# Altium footprint library PCB-Connectors-2.54mm-排针排母.PCBLIB: 183 footprints (part 3 of 12)
Each footprint in its own frame and in the unit in brackets; x right, y up, seen from the top. Pads: shape width x height; smd on the part's side, far side on the other; paste and mask are expansions set on the pad; w line width, h text height; cw(c..) or ccw(c..) is an arc to the next point about the centre after c.
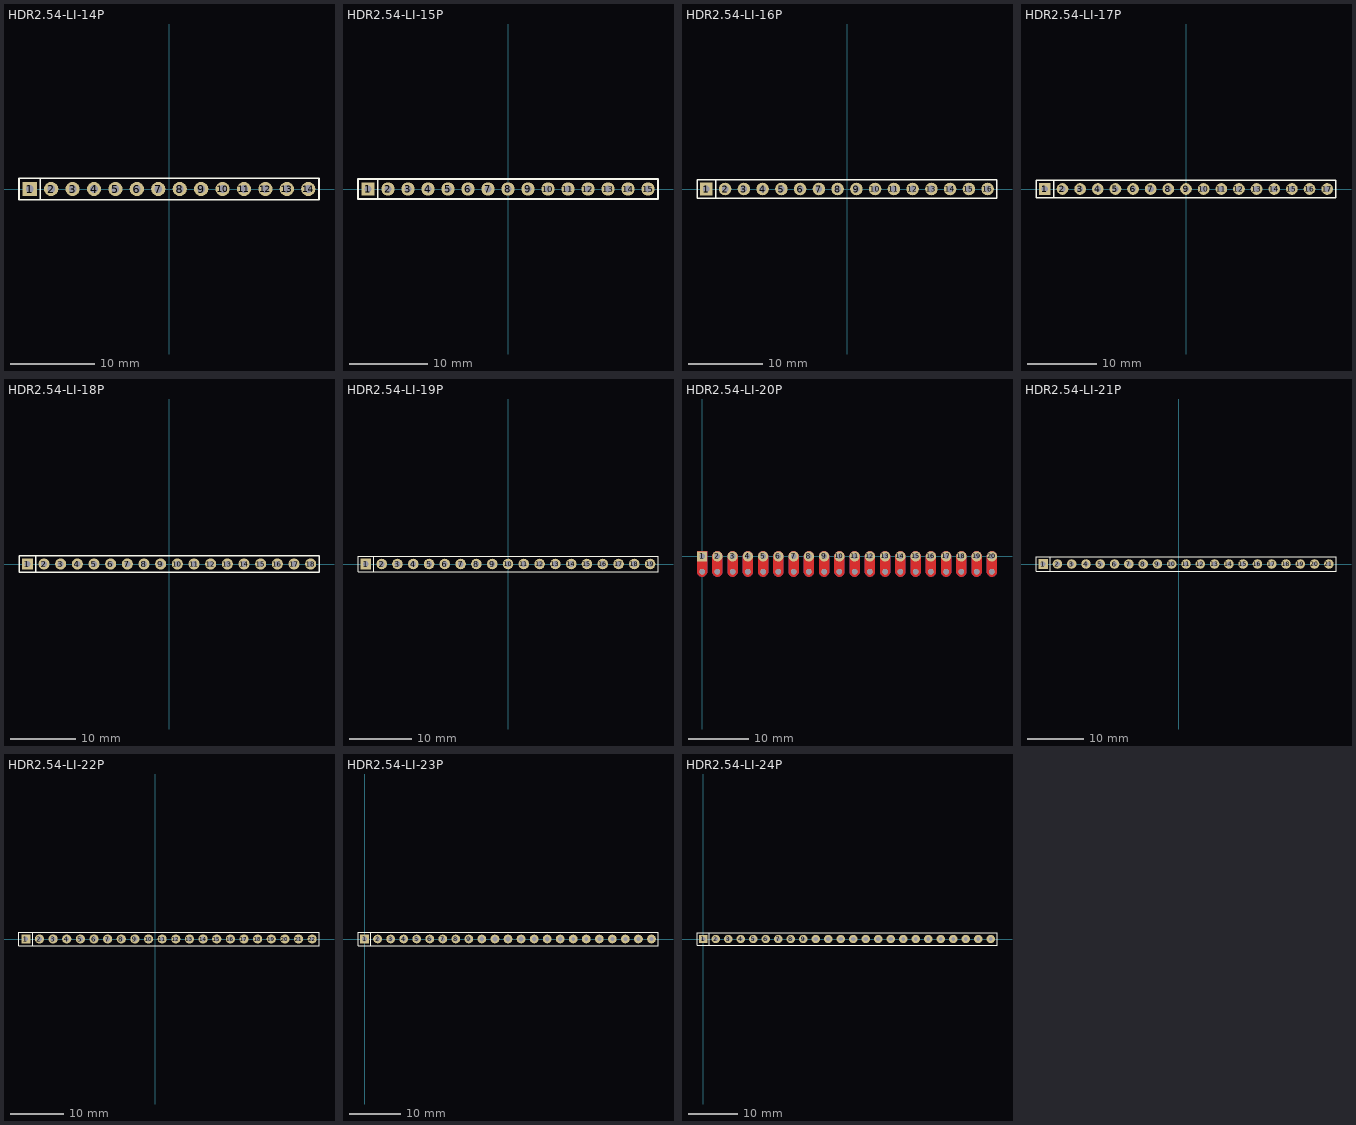
[diagram p2: the footprints below, top view; thin cyan lines are the x and y axes]

## HDR2.54-LI-14P [mm]
pads (14):
  rect 1.7x1.7 hole 0.9: 1(-16.51,0)
  round 1.7 hole 0.9: 2(-13.97,0) 3(-11.43,0) 4(-8.89,0) 5(-6.35,0) 6(-3.81,0) 7(-1.27,0) 8(1.27,0) 9(3.81,0) 10(6.35,0) 11(8.89,0) 12(11.43,0) 13(13.97,0) 14(16.51,0)
Top Overlay:
  lines w0.2: -15.26,-1.25 -15.26,1.25 ; -17.78,-1.27 17.78,-1.27 17.78,1.27 -15.875,1.27 -17.78,1.27 -17.78,-1.27
3D body "HDR2.54-1P.STEP": height 2.54, standoff -8.96, extent -17.78,-1.27 -15.24,1.27
3D body "HDR2.54-1P.STEP": height 2.54, standoff -8.96, extent -15.24,-1.27 -12.7,1.27
3D body "HDR2.54-1P.STEP": height 2.54, standoff -8.96, extent -12.7,-1.27 -10.16,1.27
3D body "HDR2.54-1P.STEP": height 2.54, standoff -8.96, extent -10.16,-1.27 -7.62,1.27
3D body "HDR2.54-1P.STEP": height 2.54, standoff -8.96, extent -7.62,-1.27 -5.08,1.27
3D body "HDR2.54-1P.STEP": height 2.54, standoff -8.96, extent -5.08,-1.27 -2.54,1.27
3D body "HDR2.54-1P.STEP": height 2.54, standoff -8.96, extent -2.54,-1.27 0,1.27
3D body "HDR2.54-1P.STEP": height 2.54, standoff -8.96, extent 0,-1.27 2.54,1.27
3D body "HDR2.54-1P.STEP": height 2.54, standoff -8.96, extent 2.54,-1.27 5.08,1.27
3D body "HDR2.54-1P.STEP": height 2.54, standoff -8.96, extent 5.08,-1.27 7.62,1.27
3D body "HDR2.54-1P.STEP": height 2.54, standoff -8.96, extent 7.62,-1.27 10.16,1.27
3D body "HDR2.54-1P.STEP": height 2.54, standoff -8.96, extent 10.16,-1.27 12.7,1.27
3D body "HDR2.54-1P.STEP": height 2.54, standoff -8.96, extent 12.7,-1.27 15.24,1.27
3D body "HDR2.54-1P.STEP": height 2.54, standoff -8.96, extent 15.24,-1.27 17.78,1.27

## HDR2.54-LI-15P [mm]
pads (15):
  rect 1.7x1.7 hole 0.9: 1(-17.78,0)
  round 1.7 hole 0.9: 2(-15.24,0) 3(-12.7,0) 4(-10.16,0) 5(-7.62,0) 6(-5.08,0) 7(-2.54,0) 8(0,0) 9(2.54,0) 10(5.08,0) 11(7.62,0) 12(10.16,0) 13(12.7,0) 14(15.24,0) 15(17.78,0)
Top Overlay:
  lines w0.2: -16.53,-1.25 -16.53,1.25 ; -19.05,-1.27 19.05,-1.27 19.05,1.27 -17.145,1.27 -19.05,1.27 -19.05,-1.27
3D body "HDR2.54-1P.STEP": height 2.54, standoff -8.96, extent 16.51,-1.27 19.05,1.27
3D body "HDR2.54-1P.STEP": height 2.54, standoff -8.96, extent 13.97,-1.27 16.51,1.27
3D body "HDR2.54-1P.STEP": height 2.54, standoff -8.96, extent 11.43,-1.27 13.97,1.27
3D body "HDR2.54-1P.STEP": height 2.54, standoff -8.96, extent 8.89,-1.27 11.43,1.27
3D body "HDR2.54-1P.STEP": height 2.54, standoff -8.96, extent 6.35,-1.27 8.89,1.27
3D body "HDR2.54-1P.STEP": height 2.54, standoff -8.96, extent 3.81,-1.27 6.35,1.27
3D body "HDR2.54-1P.STEP": height 2.54, standoff -8.96, extent 1.27,-1.27 3.81,1.27
3D body "HDR2.54-1P.STEP": height 2.54, standoff -8.96, extent -1.27,-1.27 1.27,1.27
3D body "HDR2.54-1P.STEP": height 2.54, standoff -8.96, extent -3.81,-1.27 -1.27,1.27
3D body "HDR2.54-1P.STEP": height 2.54, standoff -8.96, extent -6.35,-1.27 -3.81,1.27
3D body "HDR2.54-1P.STEP": height 2.54, standoff -8.96, extent -8.89,-1.27 -6.35,1.27
3D body "HDR2.54-1P.STEP": height 2.54, standoff -8.96, extent -11.43,-1.27 -8.89,1.27
3D body "HDR2.54-1P.STEP": height 2.54, standoff -8.96, extent -13.97,-1.27 -11.43,1.27
3D body "HDR2.54-1P.STEP": height 2.54, standoff -8.96, extent -16.51,-1.27 -13.97,1.27
3D body "HDR2.54-1P.STEP": height 2.54, standoff -8.96, extent -19.05,-1.27 -16.51,1.27

## HDR2.54-LI-16P [mm]
pads (16):
  rect 1.7x1.7 hole 0.9: 1(-19.05,0)
  round 1.7 hole 0.9: 2(-16.51,0) 3(-13.97,0) 4(-11.43,0) 5(-8.89,0) 6(-6.35,0) 7(-3.81,0) 8(-1.27,0) 9(1.27,0) 10(3.81,0) 11(6.35,0) 12(8.89,0) 13(11.43,0) 14(13.97,0) 15(16.51,0) 16(19.05,0)
Top Overlay:
  lines w0.2: -17.8,-1.25 -17.8,1.25 ; -20.32,-1.27 20.32,-1.27 20.32,1.27 -18.415,1.27 -20.32,1.27 -20.32,-1.27
3D body "HDR2.54-1P.STEP": height 2.54, standoff -8.96, extent -20.32,-1.27 -17.78,1.27
3D body "HDR2.54-1P.STEP": height 2.54, standoff -8.96, extent -17.78,-1.27 -15.24,1.27
3D body "HDR2.54-1P.STEP": height 2.54, standoff -8.96, extent -15.24,-1.27 -12.7,1.27
3D body "HDR2.54-1P.STEP": height 2.54, standoff -8.96, extent -12.7,-1.27 -10.16,1.27
3D body "HDR2.54-1P.STEP": height 2.54, standoff -8.96, extent -10.16,-1.27 -7.62,1.27
3D body "HDR2.54-1P.STEP": height 2.54, standoff -8.96, extent -7.62,-1.27 -5.08,1.27
3D body "HDR2.54-1P.STEP": height 2.54, standoff -8.96, extent -5.08,-1.27 -2.54,1.27
3D body "HDR2.54-1P.STEP": height 2.54, standoff -8.96, extent -2.54,-1.27 0,1.27
3D body "HDR2.54-1P.STEP": height 2.54, standoff -8.96, extent 0,-1.27 2.54,1.27
3D body "HDR2.54-1P.STEP": height 2.54, standoff -8.96, extent 2.54,-1.27 5.08,1.27
3D body "HDR2.54-1P.STEP": height 2.54, standoff -8.96, extent 5.08,-1.27 7.62,1.27
3D body "HDR2.54-1P.STEP": height 2.54, standoff -8.96, extent 7.62,-1.27 10.16,1.27
3D body "HDR2.54-1P.STEP": height 2.54, standoff -8.96, extent 10.16,-1.27 12.7,1.27
3D body "HDR2.54-1P.STEP": height 2.54, standoff -8.96, extent 12.7,-1.27 15.24,1.27
3D body "HDR2.54-1P.STEP": height 2.54, standoff -8.96, extent 15.24,-1.27 17.78,1.27
3D body "HDR2.54-1P.STEP": height 2.54, standoff -8.96, extent 17.78,-1.27 20.32,1.27

## HDR2.54-LI-17P [mm]
pads (17):
  rect 1.7x1.7 hole 0.9: 1(-20.32,0)
  round 1.7 hole 0.9: 2(-17.78,0) 3(-15.24,0) 4(-12.7,0) 5(-10.16,0) 6(-7.62,0) 7(-5.08,0) 8(-2.54,0) 9(0,0) 10(2.54,0) 11(5.08,0) 12(7.62,0) 13(10.16,0) 14(12.7,0) 15(15.24,0) 16(17.78,0) 17(20.32,0)
Top Overlay:
  lines w0.2: -21.59,-1.27 -21.59,1.27 -19.685,1.27 21.59,1.27 21.59,-1.27 -19.07,-1.27 -19.07,1.25
  lines w0.203: -21.59,-1.27 -18.796,-1.27
3D body "HDR2.54-1P.STEP": height 2.54, standoff -8.96, extent -21.59,-1.27 -19.05,1.27
3D body "HDR2.54-1P.STEP": height 2.54, standoff -8.96, extent -19.05,-1.27 -16.51,1.27
3D body "HDR2.54-1P.STEP": height 2.54, standoff -8.96, extent -16.51,-1.27 -13.97,1.27
3D body "HDR2.54-1P.STEP": height 2.54, standoff -8.96, extent -13.97,-1.27 -11.43,1.27
3D body "HDR2.54-1P.STEP": height 2.54, standoff -8.96, extent -11.43,-1.27 -8.89,1.27
3D body "HDR2.54-1P.STEP": height 2.54, standoff -8.96, extent -8.89,-1.27 -6.35,1.27
3D body "HDR2.54-1P.STEP": height 2.54, standoff -8.96, extent -6.35,-1.27 -3.81,1.27
3D body "HDR2.54-1P.STEP": height 2.54, standoff -8.96, extent -3.81,-1.27 -1.27,1.27
3D body "HDR2.54-1P.STEP": height 2.54, standoff -8.96, extent -1.27,-1.27 1.27,1.27
3D body "HDR2.54-1P.STEP": height 2.54, standoff -8.96, extent 1.27,-1.27 3.81,1.27
3D body "HDR2.54-1P.STEP": height 2.54, standoff -8.96, extent 3.81,-1.27 6.35,1.27
3D body "HDR2.54-1P.STEP": height 2.54, standoff -8.96, extent 6.35,-1.27 8.89,1.27
3D body "HDR2.54-1P.STEP": height 2.54, standoff -8.96, extent 8.89,-1.27 11.43,1.27
3D body "HDR2.54-1P.STEP": height 2.54, standoff -8.96, extent 11.43,-1.27 13.97,1.27
3D body "HDR2.54-1P.STEP": height 2.54, standoff -8.96, extent 13.97,-1.27 16.51,1.27
3D body "HDR2.54-1P.STEP": height 2.54, standoff -8.96, extent 16.51,-1.27 19.05,1.27
3D body "HDR2.54-1P.STEP": height 2.54, standoff -8.96, extent 19.05,-1.27 21.59,1.27

## HDR2.54-LI-18P [mm]
pads (18):
  rect 1.7x1.7 hole 0.9: 1(-21.59,0)
  round 1.7 hole 0.9: 2(-19.05,0) 3(-16.51,0) 4(-13.97,0) 5(-11.43,0) 6(-8.89,0) 7(-6.35,0) 8(-3.81,0) 9(-1.27,0) 10(1.27,0) 11(3.81,0) 12(6.35,0) 13(8.89,0) 14(11.43,0) 15(13.97,0) 16(16.51,0) 17(19.05,0) 18(21.59,0)
Top Overlay:
  lines w0.2: -21.082,1.27 22.86,1.27 22.86,-1.27 -22.86,-1.27 -22.86,1.27 -20.955,1.27 ; -20.34,-1.25 -20.34,1.25
3D body "HDR2.54-1P.STEP": height 2.54, standoff -8.96, extent -22.86,-1.27 -20.32,1.27
3D body "HDR2.54-1P.STEP": height 2.54, standoff -8.96, extent -20.32,-1.27 -17.78,1.27
3D body "HDR2.54-1P.STEP": height 2.54, standoff -8.96, extent -17.78,-1.27 -15.24,1.27
3D body "HDR2.54-1P.STEP": height 2.54, standoff -8.96, extent -15.24,-1.27 -12.7,1.27
3D body "HDR2.54-1P.STEP": height 2.54, standoff -8.96, extent -12.7,-1.27 -10.16,1.27
3D body "HDR2.54-1P.STEP": height 2.54, standoff -8.96, extent -10.16,-1.27 -7.62,1.27
3D body "HDR2.54-1P.STEP": height 2.54, standoff -8.96, extent -7.62,-1.27 -5.08,1.27
3D body "HDR2.54-1P.STEP": height 2.54, standoff -8.96, extent -5.08,-1.27 -2.54,1.27
3D body "HDR2.54-1P.STEP": height 2.54, standoff -8.96, extent -2.54,-1.27 0,1.27
3D body "HDR2.54-1P.STEP": height 2.54, standoff -8.96, extent 0,-1.27 2.54,1.27
3D body "HDR2.54-1P.STEP": height 2.54, standoff -8.96, extent 2.54,-1.27 5.08,1.27
3D body "HDR2.54-1P.STEP": height 2.54, standoff -8.96, extent 5.08,-1.27 7.62,1.27
3D body "HDR2.54-1P.STEP": height 2.54, standoff -8.96, extent 7.62,-1.27 10.16,1.27
3D body "HDR2.54-1P.STEP": height 2.54, standoff -8.96, extent 10.16,-1.27 12.7,1.27
3D body "HDR2.54-1P.STEP": height 2.54, standoff -8.96, extent 12.7,-1.27 15.24,1.27
3D body "HDR2.54-1P.STEP": height 2.54, standoff -8.96, extent 15.24,-1.27 17.78,1.27
3D body "HDR2.54-1P.STEP": height 2.54, standoff -8.96, extent 17.78,-1.27 20.32,1.27
3D body "HDR2.54-1P.STEP": height 2.54, standoff -8.96, extent 20.32,-1.27 22.86,1.27

## HDR2.54-LI-19P [mm]
pads (19):
  rect 1.7x1.7 hole 0.9: 1(-22.86,0)
  round 1.7 hole 0.9: 2(-20.32,0) 3(-17.78,0) 4(-15.24,0) 5(-12.7,0) 6(-10.16,0) 7(-7.62,0) 8(-5.08,0) 9(-2.54,0) 10(0,0) 11(2.54,0) 12(5.08,0) 13(7.62,0) 14(10.16,0) 15(12.7,0) 16(15.24,0) 17(17.78,0) 18(20.32,0) 19(22.86,0)
Top Overlay:
  lines w0.2: -21.61,-1.25 -21.61,1.25 ; -24.13,-1.27 24.13,-1.27 24.13,1.27 -22.225,1.27 -24.13,1.27 -24.13,-1.27
3D body "HDR2.54-1P.STEP": height 2.54, standoff -8.96, extent -24.13,-1.27 -21.59,1.27
3D body "HDR2.54-1P.STEP": height 2.54, standoff -8.96, extent -21.59,-1.27 -19.05,1.27
3D body "HDR2.54-1P.STEP": height 2.54, standoff -8.96, extent -19.05,-1.27 -16.51,1.27
3D body "HDR2.54-1P.STEP": height 2.54, standoff -8.96, extent -16.51,-1.27 -13.97,1.27
3D body "HDR2.54-1P.STEP": height 2.54, standoff -8.96, extent -13.97,-1.27 -11.43,1.27
3D body "HDR2.54-1P.STEP": height 2.54, standoff -8.96, extent -11.43,-1.27 -8.89,1.27
3D body "HDR2.54-1P.STEP": height 2.54, standoff -8.96, extent -8.89,-1.27 -6.35,1.27
3D body "HDR2.54-1P.STEP": height 2.54, standoff -8.96, extent -6.35,-1.27 -3.81,1.27
3D body "HDR2.54-1P.STEP": height 2.54, standoff -8.96, extent -3.81,-1.27 -1.27,1.27
3D body "HDR2.54-1P.STEP": height 2.54, standoff -8.96, extent -1.27,-1.27 1.27,1.27
3D body "HDR2.54-1P.STEP": height 2.54, standoff -8.96, extent 1.27,-1.27 3.81,1.27
3D body "HDR2.54-1P.STEP": height 2.54, standoff -8.96, extent 3.81,-1.27 6.35,1.27
3D body "HDR2.54-1P.STEP": height 2.54, standoff -8.96, extent 6.35,-1.27 8.89,1.27
3D body "HDR2.54-1P.STEP": height 2.54, standoff -8.96, extent 8.89,-1.27 11.43,1.27
3D body "HDR2.54-1P.STEP": height 2.54, standoff -8.96, extent 11.43,-1.27 13.97,1.27
3D body "HDR2.54-1P.STEP": height 2.54, standoff -8.96, extent 13.97,-1.27 16.51,1.27
3D body "HDR2.54-1P.STEP": height 2.54, standoff -8.96, extent 16.51,-1.27 19.05,1.27
3D body "HDR2.54-1P.STEP": height 2.54, standoff -8.96, extent 19.05,-1.27 21.59,1.27
3D body "HDR2.54-1P.STEP": height 2.54, standoff -8.96, extent 21.59,-1.27 24.13,1.27

## HDR2.54-LI-20P [mm]
pads (40):
  round 0.925 hole 0.9: 1(0,-2.54) 2(2.54,-2.54) 3(5.08,-2.54) 4(7.62,-2.54) 5(10.16,-2.54) 6(12.7,-2.54) 7(15.24,-2.54) 8(17.78,-2.54) 9(20.32,-2.54) 10(22.86,-2.54) 11(25.4,-2.54) 12(27.94,-2.54) 13(30.48,-2.54) 14(33.02,-2.54) 15(35.56,-2.54) 16(38.1,-2.54) 17(40.64,-2.54) 18(43.18,-2.54) 19(45.72,-2.54) 20(48.26,-2.54)
  rect 1.7x1.7 hole 0.9: 1(0,0)
  round 1.7 hole 0.9: 2(2.54,0) 3(5.08,0) 4(7.62,0) 5(10.16,0) 6(12.7,0) 7(15.24,0) 8(17.78,0) 9(20.32,0) 10(22.86,0) 11(25.4,0) 12(27.94,0) 13(30.48,0) 14(33.02,0) 15(35.56,0) 16(38.1,0) 17(40.64,0) 18(43.18,0) 19(45.72,0) 20(48.26,0)
Top:
  region: 47.41,0 47.41,-2.54 47.41,-2.596 47.425,-2.706 47.453,-2.814 47.496,-2.917 47.552,-3.013 47.62,-3.102 47.698,-3.18 47.787,-3.248 47.883,-3.304 47.986,-3.347 48.094,-3.375 48.204,-3.39 48.26,-3.39 48.316,-3.39 48.426,-3.375 48.534,-3.347 48.637,-3.304 48.733,-3.248 48.822,-3.18 48.9,-3.102 48.968,-3.013 49.024,-2.917 49.067,-2.814 49.095,-2.706 49.11,-2.596 49.11,-2.54 49.11,0 49.11,0.056 49.095,0.166 49.067,0.274 49.024,0.377 48.968,0.473 48.9,0.562 48.822,0.64 48.733,0.708 48.637,0.764 48.534,0.807 48.426,0.835 48.316,0.85 48.26,0.85 48.204,0.85 48.094,0.835 47.986,0.807 47.883,0.764 47.787,0.708 47.698,0.64 47.62,0.562 47.552,0.473 47.496,0.377 47.453,0.274 47.425,0.166 47.41,0.056
  region: 44.87,0 44.87,-2.54 44.87,-2.596 44.885,-2.706 44.913,-2.814 44.956,-2.917 45.012,-3.013 45.08,-3.102 45.158,-3.18 45.247,-3.248 45.343,-3.304 45.446,-3.347 45.554,-3.375 45.664,-3.39 45.72,-3.39 45.776,-3.39 45.886,-3.375 45.994,-3.347 46.097,-3.304 46.193,-3.248 46.282,-3.18 46.36,-3.102 46.428,-3.013 46.484,-2.917 46.527,-2.814 46.555,-2.706 46.57,-2.596 46.57,-2.54 46.57,0 46.57,0.056 46.555,0.166 46.527,0.274 46.484,0.377 46.428,0.473 46.36,0.562 46.282,0.64 46.193,0.708 46.097,0.764 45.994,0.807 45.886,0.835 45.776,0.85 45.72,0.85 45.664,0.85 45.554,0.835 45.446,0.807 45.343,0.764 45.247,0.708 45.158,0.64 45.08,0.562 45.012,0.473 44.956,0.377 44.913,0.274 44.885,0.166 44.87,0.056
  region: 42.33,0 42.33,-2.54 42.33,-2.596 42.345,-2.706 42.373,-2.814 42.416,-2.917 42.472,-3.013 42.54,-3.102 42.618,-3.18 42.707,-3.248 42.803,-3.304 42.906,-3.347 43.014,-3.375 43.124,-3.39 43.18,-3.39 43.236,-3.39 43.346,-3.375 43.454,-3.347 43.557,-3.304 43.653,-3.248 43.742,-3.18 43.82,-3.102 43.888,-3.013 43.944,-2.917 43.987,-2.814 44.015,-2.706 44.03,-2.596 44.03,-2.54 44.03,0 44.03,0.056 44.015,0.166 43.987,0.274 43.944,0.377 43.888,0.473 43.82,0.562 43.742,0.64 43.653,0.708 43.557,0.764 43.454,0.807 43.346,0.835 43.236,0.85 43.18,0.85 43.124,0.85 43.014,0.835 42.906,0.807 42.803,0.764 42.707,0.708 42.618,0.64 42.54,0.562 42.472,0.473 42.416,0.377 42.373,0.274 42.345,0.166 42.33,0.056
  region: 39.79,0 39.79,-2.54 39.79,-2.596 39.805,-2.706 39.833,-2.814 39.876,-2.917 39.932,-3.013 40,-3.102 40.078,-3.18 40.167,-3.248 40.263,-3.304 40.366,-3.347 40.474,-3.375 40.584,-3.39 40.64,-3.39 40.696,-3.39 40.806,-3.375 40.914,-3.347 41.017,-3.304 41.113,-3.248 41.202,-3.18 41.28,-3.102 41.348,-3.013 41.404,-2.917 41.447,-2.814 41.475,-2.706 41.49,-2.596 41.49,-2.54 41.49,0 41.49,0.056 41.475,0.166 41.447,0.274 41.404,0.377 41.348,0.473 41.28,0.562 41.202,0.64 41.113,0.708 41.017,0.764 40.914,0.807 40.806,0.835 40.696,0.85 40.64,0.85 40.584,0.85 40.474,0.835 40.366,0.807 40.263,0.764 40.167,0.708 40.078,0.64 40,0.562 39.932,0.473 39.876,0.377 39.833,0.274 39.805,0.166 39.79,0.056
  region: 37.25,0 37.25,-2.54 37.25,-2.596 37.265,-2.706 37.293,-2.814 37.336,-2.917 37.392,-3.013 37.46,-3.102 37.538,-3.18 37.627,-3.248 37.723,-3.304 37.826,-3.347 37.934,-3.375 38.044,-3.39 38.1,-3.39 38.156,-3.39 38.266,-3.375 38.374,-3.347 38.477,-3.304 38.573,-3.248 38.662,-3.18 38.74,-3.102 38.808,-3.013 38.864,-2.917 38.907,-2.814 38.935,-2.706 38.95,-2.596 38.95,-2.54 38.95,0 38.95,0.056 38.935,0.166 38.907,0.274 38.864,0.377 38.808,0.473 38.74,0.562 38.662,0.64 38.573,0.708 38.477,0.764 38.374,0.807 38.266,0.835 38.156,0.85 38.1,0.85 38.044,0.85 37.934,0.835 37.826,0.807 37.723,0.764 37.627,0.708 37.538,0.64 37.46,0.562 37.392,0.473 37.336,0.377 37.293,0.274 37.265,0.166 37.25,0.056
  region: 16.93,0 16.93,-2.54 16.93,-2.596 16.945,-2.706 16.973,-2.814 17.016,-2.917 17.072,-3.013 17.14,-3.102 17.218,-3.18 17.307,-3.248 17.403,-3.304 17.506,-3.347 17.614,-3.375 17.724,-3.39 17.78,-3.39 17.836,-3.39 17.946,-3.375 18.054,-3.347 18.157,-3.304 18.253,-3.248 18.342,-3.18 18.42,-3.102 18.488,-3.013 18.544,-2.917 18.587,-2.814 18.615,-2.706 18.63,-2.596 18.63,-2.54 18.63,0 18.63,0.056 18.615,0.166 18.587,0.274 18.544,0.377 18.488,0.473 18.42,0.562 18.342,0.64 18.253,0.708 18.157,0.764 18.054,0.807 17.946,0.835 17.836,0.85 17.78,0.85 17.724,0.85 17.614,0.835 17.506,0.807 17.403,0.764 17.307,0.708 17.218,0.64 17.14,0.562 17.072,0.473 17.016,0.377 16.973,0.274 16.945,0.166 16.93,0.056
  region: 34.71,0 34.71,-2.54 34.71,-2.596 34.725,-2.706 34.753,-2.814 34.796,-2.917 34.852,-3.013 34.92,-3.102 34.998,-3.18 35.087,-3.248 35.183,-3.304 35.286,-3.347 35.394,-3.375 35.504,-3.39 35.56,-3.39 35.616,-3.39 35.726,-3.375 35.834,-3.347 35.937,-3.304 36.033,-3.248 36.122,-3.18 36.2,-3.102 36.268,-3.013 36.324,-2.917 36.367,-2.814 36.395,-2.706 36.41,-2.596 36.41,-2.54 36.41,0 36.41,0.056 36.395,0.166 36.367,0.274 36.324,0.377 36.268,0.473 36.2,0.562 36.122,0.64 36.033,0.708 35.937,0.764 35.834,0.807 35.726,0.835 35.616,0.85 35.56,0.85 35.504,0.85 35.394,0.835 35.286,0.807 35.183,0.764 35.087,0.708 34.998,0.64 34.92,0.562 34.852,0.473 34.796,0.377 34.753,0.274 34.725,0.166 34.71,0.056
  region: 32.17,0 32.17,-2.54 32.17,-2.596 32.185,-2.706 32.213,-2.814 32.256,-2.917 32.312,-3.013 32.38,-3.102 32.458,-3.18 32.547,-3.248 32.643,-3.304 32.746,-3.347 32.854,-3.375 32.964,-3.39 33.02,-3.39 33.076,-3.39 33.186,-3.375 33.294,-3.347 33.397,-3.304 33.493,-3.248 33.582,-3.18 33.66,-3.102 33.728,-3.013 33.784,-2.917 33.827,-2.814 33.855,-2.706 33.87,-2.596 33.87,-2.54 33.87,0 33.87,0.056 33.855,0.166 33.827,0.274 33.784,0.377 33.728,0.473 33.66,0.562 33.582,0.64 33.493,0.708 33.397,0.764 33.294,0.807 33.186,0.835 33.076,0.85 33.02,0.85 32.964,0.85 32.854,0.835 32.746,0.807 32.643,0.764 32.547,0.708 32.458,0.64 32.38,0.562 32.312,0.473 32.256,0.377 32.213,0.274 32.185,0.166 32.17,0.056
  region: 29.63,0 29.63,-2.54 29.63,-2.596 29.645,-2.706 29.673,-2.814 29.716,-2.917 29.772,-3.013 29.84,-3.102 29.918,-3.18 30.007,-3.248 30.103,-3.304 30.206,-3.347 30.314,-3.375 30.424,-3.39 30.48,-3.39 30.536,-3.39 30.646,-3.375 30.754,-3.347 30.857,-3.304 30.953,-3.248 31.042,-3.18 31.12,-3.102 31.188,-3.013 31.244,-2.917 31.287,-2.814 31.315,-2.706 31.33,-2.596 31.33,-2.54 31.33,0 31.33,0.056 31.315,0.166 31.287,0.274 31.244,0.377 31.188,0.473 31.12,0.562 31.042,0.64 30.953,0.708 30.857,0.764 30.754,0.807 30.646,0.835 30.536,0.85 30.48,0.85 30.424,0.85 30.314,0.835 30.206,0.807 30.103,0.764 30.007,0.708 29.918,0.64 29.84,0.562 29.772,0.473 29.716,0.377 29.673,0.274 29.645,0.166 29.63,0.056
  region: 27.09,0 27.09,-2.54 27.09,-2.596 27.105,-2.706 27.133,-2.814 27.176,-2.917 27.232,-3.013 27.3,-3.102 27.378,-3.18 27.467,-3.248 27.563,-3.304 27.666,-3.347 27.774,-3.375 27.884,-3.39 27.94,-3.39 27.996,-3.39 28.106,-3.375 28.214,-3.347 28.317,-3.304 28.413,-3.248 28.502,-3.18 28.58,-3.102 28.648,-3.013 28.704,-2.917 28.747,-2.814 28.775,-2.706 28.79,-2.596 28.79,-2.54 28.79,0 28.79,0.056 28.775,0.166 28.747,0.274 28.704,0.377 28.648,0.473 28.58,0.562 28.502,0.64 28.413,0.708 28.317,0.764 28.214,0.807 28.106,0.835 27.996,0.85 27.94,0.85 27.884,0.85 27.774,0.835 27.666,0.807 27.563,0.764 27.467,0.708 27.378,0.64 27.3,0.562 27.232,0.473 27.176,0.377 27.133,0.274 27.105,0.166 27.09,0.056
  region: 24.55,0 24.55,-2.54 24.55,-2.596 24.565,-2.706 24.593,-2.814 24.636,-2.917 24.692,-3.013 24.76,-3.102 24.838,-3.18 24.927,-3.248 25.023,-3.304 25.126,-3.347 25.234,-3.375 25.344,-3.39 25.4,-3.39 25.456,-3.39 25.566,-3.375 25.674,-3.347 25.777,-3.304 25.873,-3.248 25.962,-3.18 26.04,-3.102 26.108,-3.013 26.164,-2.917 26.207,-2.814 26.235,-2.706 26.25,-2.596 26.25,-2.54 26.25,0 26.25,0.056 26.235,0.166 26.207,0.274 26.164,0.377 26.108,0.473 26.04,0.562 25.962,0.64 25.873,0.708 25.777,0.764 25.674,0.807 25.566,0.835 25.456,0.85 25.4,0.85 25.344,0.85 25.234,0.835 25.126,0.807 25.023,0.764 24.927,0.708 24.838,0.64 24.76,0.562 24.692,0.473 24.636,0.377 24.593,0.274 24.565,0.166 24.55,0.056
  region: 22.01,0 22.01,-2.54 22.01,-2.596 22.025,-2.706 22.053,-2.814 22.096,-2.917 22.152,-3.013 22.22,-3.102 22.298,-3.18 22.387,-3.248 22.483,-3.304 22.586,-3.347 22.694,-3.375 22.804,-3.39 22.86,-3.39 22.916,-3.39 23.026,-3.375 23.134,-3.347 23.237,-3.304 23.333,-3.248 23.422,-3.18 23.5,-3.102 23.568,-3.013 23.624,-2.917 23.667,-2.814 23.695,-2.706 23.71,-2.596 23.71,-2.54 23.71,0 23.71,0.056 23.695,0.166 23.667,0.274 23.624,0.377 23.568,0.473 23.5,0.562 23.422,0.64 23.333,0.708 23.237,0.764 23.134,0.807 23.026,0.835 22.916,0.85 22.86,0.85 22.804,0.85 22.694,0.835 22.586,0.807 22.483,0.764 22.387,0.708 22.298,0.64 22.22,0.562 22.152,0.473 22.096,0.377 22.053,0.274 22.025,0.166 22.01,0.056
  region: 19.47,0 19.47,-2.54 19.47,-2.596 19.485,-2.706 19.513,-2.814 19.556,-2.917 19.612,-3.013 19.68,-3.102 19.758,-3.18 19.847,-3.248 19.943,-3.304 20.046,-3.347 20.154,-3.375 20.264,-3.39 20.32,-3.39 20.376,-3.39 20.486,-3.375 20.594,-3.347 20.697,-3.304 20.793,-3.248 20.882,-3.18 20.96,-3.102 21.028,-3.013 21.084,-2.917 21.127,-2.814 21.155,-2.706 21.17,-2.596 21.17,-2.54 21.17,0 21.17,0.056 21.155,0.166 21.127,0.274 21.084,0.377 21.028,0.473 20.96,0.562 20.882,0.64 20.793,0.708 20.697,0.764 20.594,0.807 20.486,0.835 20.376,0.85 20.32,0.85 20.264,0.85 20.154,0.835 20.046,0.807 19.943,0.764 19.847,0.708 19.758,0.64 19.68,0.562 19.612,0.473 19.556,0.377 19.513,0.274 19.485,0.166 19.47,0.056
  region: 14.39,0 14.39,-2.54 14.39,-2.596 14.405,-2.706 14.433,-2.814 14.476,-2.917 14.532,-3.013 14.6,-3.102 14.678,-3.18 14.767,-3.248 14.863,-3.304 14.966,-3.347 15.074,-3.375 15.184,-3.39 15.24,-3.39 15.296,-3.39 15.406,-3.375 15.514,-3.347 15.617,-3.304 15.713,-3.248 15.802,-3.18 15.88,-3.102 15.948,-3.013 16.004,-2.917 16.047,-2.814 16.075,-2.706 16.09,-2.596 16.09,-2.54 16.09,0 16.09,0.056 16.075,0.166 16.047,0.274 16.004,0.377 15.948,0.473 15.88,0.562 15.802,0.64 15.713,0.708 15.617,0.764 15.514,0.807 15.406,0.835 15.296,0.85 15.24,0.85 15.184,0.85 15.074,0.835 14.966,0.807 14.863,0.764 14.767,0.708 14.678,0.64 14.6,0.562 14.532,0.473 14.476,0.377 14.433,0.274 14.405,0.166 14.39,0.056
  region: 11.85,0 11.85,-2.54 11.85,-2.596 11.865,-2.706 11.893,-2.814 11.936,-2.917 11.992,-3.013 12.06,-3.102 12.138,-3.18 12.227,-3.248 12.323,-3.304 12.426,-3.347 12.534,-3.375 12.644,-3.39 12.7,-3.39 12.756,-3.39 12.866,-3.375 12.974,-3.347 13.077,-3.304 13.173,-3.248 13.262,-3.18 13.34,-3.102 13.408,-3.013 13.464,-2.917 13.507,-2.814 13.535,-2.706 13.55,-2.596 13.55,-2.54 13.55,0 13.55,0.056 13.535,0.166 13.507,0.274 13.464,0.377 13.408,0.473 13.34,0.562 13.262,0.64 13.173,0.708 13.077,0.764 12.974,0.807 12.866,0.835 12.756,0.85 12.7,0.85 12.644,0.85 12.534,0.835 12.426,0.807 12.323,0.764 12.227,0.708 12.138,0.64 12.06,0.562 11.992,0.473 11.936,0.377 11.893,0.274 11.865,0.166 11.85,0.056
  region: 9.31,0 9.31,-2.54 9.31,-2.596 9.325,-2.706 9.353,-2.814 9.396,-2.917 9.452,-3.013 9.52,-3.102 9.598,-3.18 9.687,-3.248 9.783,-3.304 9.886,-3.347 9.994,-3.375 10.104,-3.39 10.16,-3.39 10.216,-3.39 10.326,-3.375 10.434,-3.347 10.537,-3.304 10.633,-3.248 10.722,-3.18 10.8,-3.102 10.868,-3.013 10.924,-2.917 10.967,-2.814 10.995,-2.706 11.01,-2.596 11.01,-2.54 11.01,0 11.01,0.056 10.995,0.166 10.967,0.274 10.924,0.377 10.868,0.473 10.8,0.562 10.722,0.64 10.633,0.708 10.537,0.764 10.434,0.807 10.326,0.835 10.216,0.85 10.16,0.85 10.104,0.85 9.994,0.835 9.886,0.807 9.783,0.764 9.687,0.708 9.598,0.64 9.52,0.562 9.452,0.473 9.396,0.377 9.353,0.274 9.325,0.166 9.31,0.056